# Altium footprint library CPU_STM.PcbLib: 216 footprints (part 5 of 15) (continued)
## ENVEST_BOTTOM [mm] (continued)
; 9.194,-2.454 9.397,-2.454 ; 9.194,-2.404 9.346,-2.404 ; 9.194,-2.353 9.295,-2.353 ; 9.194,-2.302 9.295,-2.302 ; 9.194,-2.251 9.295,-2.251 ; 9.194,-2.2 9.295,-2.2 ; 9.194,-2.15 9.295,-2.15 ; 9.194,-1.743 9.346,-1.743 ; 9.194,-1.692 9.346,-1.692 ; 9.194,-1.642 9.346,-1.642 ; 9.194,-1.591 9.346,-1.591 ; 9.194,-1.54 9.346,-1.54 ; 9.194,-1.489 9.346,-1.489 ; 9.194,-1.438 9.346,-1.438 ; 9.194,-1.388 9.346,-1.388 ; 9.194,-1.337 9.346,-1.337 ; 9.194,0.035 10.515,0.035 ; 9.194,0.086 10.515,0.086 ; 9.194,0.136 10.565,0.136 ; 9.245,-2.505 9.397,-2.505 ; 9.245,-1.286 9.346,-1.286 ; 9.245,-1.235 9.346,-1.235 ; 9.245,-0.067 10.464,-0.067 ; 9.245,-0.016 10.515,-0.016 ; 9.295,-2.556 9.397,-2.556 ; 9.295,-0.219 10.413,-0.219 ; 9.295,-0.168 10.464,-0.168 ; 9.295,-0.118 10.464,-0.118 ; 9.346,-0.372 10.362,-0.372 ; 9.346,-0.321 10.362,-0.321 ; 9.346,-0.27 10.413,-0.27 ; 9.397,-0.524 10.311,-0.524 ; 9.397,-0.473 10.311,-0.473 ; 9.397,-0.422 10.362,-0.422 ; 9.448,-0.575 10.261,-0.575 ; 9.651,-2.454 9.956,-2.454 ; 9.651,-2.404 9.753,-2.404 ; 9.651,-2.353 9.753,-2.353 ; 9.651,-2.302 9.753,-2.302 ; 9.651,-2.251 9.753,-2.251 ; 9.651,-2.2 9.753,-2.2 ; 9.651,-2.15 9.753,-2.15 ; 9.651,-2.099 9.753,-2.099 ; 9.651,-2.048 9.753,-2.048 ; 9.651,-1.997 9.803,-1.997 ; 9.651,-1.946 9.803,-1.946 ; 9.651,-1.896 9.803,-1.896 ; 9.651,-1.845 9.803,-1.845 ; 9.651,-1.794 9.803,-1.794 ; 9.651,-1.743 9.803,-1.743 ; 9.702,-2.556 9.854,-2.556 ; 9.702,-2.505 9.905,-2.505 ; 9.803,-1.489 10.007,-1.489 ; 9.803,-1.438 10.007,-1.438 ; 9.803,-1.388 10.007,-1.388 ; 9.854,-2.404 10.007,-2.404 ; 9.854,-1.54 9.956,-1.54 ; 9.854,-1.337 9.956,-1.337 ; 9.905,-2.353 10.057,-2.353 ; 9.905,0.39 10.667,0.39 ; 9.905,0.441 10.667,0.441 ; 9.956,-2.302 10.108,-2.302 ; 9.956,0.492 10.667,0.492 ; 9.956,0.543 10.718,0.543 ; 9.956,0.594 10.718,0.594 ; 9.956,0.644 10.718,0.644 ; 10.007,-2.251 10.159,-2.251 ; 10.007,0.695 10.769,0.695 ; 10.007,0.746 10.769,0.746 ; 10.007,0.797 10.819,0.797 ; 10.007,0.848 10.819,0.848 ; 10.057,-2.2 10.362,-2.2 ; 10.057,0.898 10.819,0.898 ; 10.057,0.949 10.87,0.949 ; 10.057,1 10.87,1 ; 10.057,1.051 10.87,1.051 ; 10.108,-2.15 10.362,-2.15 ; 10.108,-1.489 10.311,-1.489 ; 10.108,-1.438 10.362,-1.438 ; 10.108,-1.388 10.311,-1.388 ; 10.108,1.102 10.921,1.102 ; 10.108,1.152 10.921,1.152 ; 10.108,1.203 10.972,1.203 ; 10.159,-2.099 10.362,-2.099 ; 10.159,-1.54 10.261,-1.54 ; 10.159,-1.337 10.261,-1.337 ; 10.159,1.254 10.972,1.254 ; 10.159,1.305 10.972,1.305 ; 10.159,1.356 11.023,1.356 ; 10.159,1.406 11.023,1.406 ; 10.21,-2.353 10.362,-2.353 ; 10.21,-2.302 10.362,-2.302 ; 10.21,-2.251 10.362,-2.251 ; 10.21,-2.048 10.362,-2.048 ; 10.21,1.457 11.023,1.457 ; 10.21,1.508 11.073,1.508 ; 10.21,1.559 11.073,1.559 ; 10.261,-2.454 10.413,-2.454 ; 10.261,-2.404 10.362,-2.404 ; 10.261,-1.997 10.413,-1.997 ; 10.261,-1.946 10.413,-1.946 ; 10.261,1.61 11.124,1.61 ; 10.261,1.66 11.124,1.66 ; 10.261,1.711 11.124,1.711 ; 10.261,1.762 11.175,1.762 ; 10.311,-2.505 10.616,-2.505 ; 10.311,-1.896 10.464,-1.896 ; 10.311,-1.845 10.464,-1.845 ; 10.311,-1.794 10.464,-1.794 ; 10.311,1.813 11.175,1.813 ; 10.311,1.864 11.175,1.864 ; 10.311,1.914 11.226,1.914 ; 10.311,1.965 11.226,1.965 ; 10.362,-2.556 10.565,-2.556 ; 10.362,-1.743 10.413,-1.743 ; 10.362,2.016 11.226,2.016 ; 10.515,-2.454 10.616,-2.454 ; 10.769,-2.353 11.073,-2.353 ; 10.819,-2.556 10.972,-2.556 ; 10.819,-2.505 10.972,-2.505 ; 10.819,-2.454 11.023,-2.454 ; 10.819,-2.404 11.073,-2.404 ; 10.819,-2.302 10.921,-2.302 ; 10.819,-2.251 10.921,-2.251 ; 10.819,-2.2 10.921,-2.2 ; 10.819,-2.15 10.921,-2.15 ; 10.819,-2.099 10.921,-2.099 ; 10.819,-2.048 10.921,-2.048 ; 10.819,-1.997 10.972,-1.997 ; 10.819,-1.946 10.921,-1.946 ; 10.819,-1.896 10.921,-1.896 ; 10.819,-1.845 10.921,-1.845 ; 10.819,-1.794 10.921,-1.794 ; 10.972,-2.302 11.124,-2.302 ; 11.023,-2.251 11.175,-2.251 ; 11.023,-2.2 11.226,-2.2 ; 11.073,-2.15 11.226,-2.15 ; 11.124,-2.099 11.277,-2.099 ; 11.175,-2.048 11.277,-2.048 ; 11.175,-1.997 11.327,-1.997 ; 11.226,-1.946 11.378,-1.946 ; 11.226,-1.896 11.531,-1.896 ; 11.277,-1.845 11.531,-1.845 ; 11.327,-1.794 11.48,-1.794 ; 11.327,0.39 12.14,0.39 ; 11.327,0.441 13.766,0.441 ; 11.327,0.492 13.817,0.492 ; 11.327,0.543 13.817,0.543 ; 11.327,0.594 13.817,0.594 ; 11.327,0.644 13.817,0.644 ; 11.327,0.695 13.817,0.695 ; 11.327,0.746 13.817,0.746 ; 11.327,0.797 13.817,0.797 ; 11.327,0.848 13.817,0.848 ; 11.327,0.898 13.817,0.898 ; 11.327,0.949 13.817,0.949 ; 11.378,-1.743 11.429,-1.743 ; 11.378,0.187 12.293,0.187 ; 11.378,0.238 12.242,0.238 ; 11.378,0.289 12.191,0.289 ; 11.378,0.34 12.191,0.34 ; 11.378,1 13.817,1 ; 11.378,1.051 12.14,1.051 ; 11.378,1.102 12.14,1.102 ; 11.378,1.152 12.191,1.152 ; 11.429,-2.251 11.581,-2.251 ; 11.429,-2.2 11.581,-2.2 ; 11.429,-2.15 11.531,-2.15 ; 11.429,-2.099 11.531,-2.099 ; 11.429,-2.048 11.531,-2.048 ; 11.429,-1.997 11.531,-1.997 ; 11.429,-1.946 11.531,-1.946 ; 11.429,0.086 12.445,0.086 ; 11.429,0.136 12.343,0.136 ; 11.429,1.203 12.191,1.203 ; 11.429,1.254 12.191,1.254 ; 11.429,1.305 12.242,1.305 ; 11.48,-2.454 11.785,-2.454 ; 11.48,-2.404 11.632,-2.404 ; 11.48,-2.353 11.581,-2.353 ; 11.48,-2.302 11.581,-2.302 ; 11.48,-0.016 13.613,-0.016 ; 11.48,0.035 12.597,0.035 ; 11.48,1.356 12.293,1.356 ; 11.48,1.406 12.343,1.406 ; 11.531,-2.505 11.734,-2.505 ; 11.531,-0.118 13.613,-0.118 ; 11.531,-0.067 13.613,-0.067 ; 11.531,1.457 12.394,1.457 ; 11.531,1.508 13.664,1.508 ; 11.581,-0.168 13.613,-0.168 ; 11.581,1.559 13.613,1.559 ; 11.632,-0.219 13.613,-0.219 ; 11.632,1.61 13.613,1.61 ; 11.683,-2.404 11.835,-2.404 ; 11.683,-0.27 13.664,-0.27 ; 11.683,1.66 13.563,1.66 ; 11.734,-2.353 11.886,-2.353 ; 11.734,-0.321 13.664,-0.321 ; 11.734,1.711 13.512,1.711 ; 11.785,-2.302 11.937,-2.302 ; 11.785,-0.372 13.664,-0.372 ; 11.785,1.762 13.461,1.762 ; 11.835,-2.251 11.937,-2.251 ; 11.835,1.813 13.41,1.813 ; 11.886,-2.2 11.937,-2.2 ; 11.886,-0.422 13.664,-0.422 ; 11.886,1.864 13.359,1.864 ; 11.937,-0.473 13.664,-0.473 ; 11.988,-3.013 12.14,-3.013 ; 11.988,-2.962 12.14,-2.962 ; 11.988,-2.912 12.14,-2.912 ; 11.988,1.914 13.309,1.914 ; 12.039,-3.115 12.191,-3.115 ; 12.039,-3.064 12.14,-3.064 ; 12.039,-2.861 12.191,-2.861 ; 12.039,-2.353 12.191,-2.353 ; 12.039,-2.302 12.191,-2.302 ; 12.089,-3.166 12.242,-3.166 ; 12.089,-2.81 12.293,-2.81 ; 12.089,-2.556 12.394,-2.556 ; 12.089,-2.505 12.445,-2.505 ; 12.089,-2.454 12.191,-2.454 ; 12.089,-2.404 12.191,-2.404 ; 12.089,-2.251 12.191,-2.251 ; 12.089,-2.2 12.191,-2.2 ; 12.089,-2.15 12.191,-2.15 ; 12.089,-2.099 12.242,-2.099 ; 12.089,-2.048 12.242,-2.048 ; 12.089,-1.997 12.242,-1.997 ; 12.089,-1.946 12.242,-1.946 ; 12.089,-1.896 12.242,-1.896 ; 12.089,-1.845 12.242,-1.845 ; 12.089,-1.794 12.242,-1.794 ; 12.089,-1.743 12.242,-1.743 ; 12.089,-1.692 12.191,-1.692 ; 12.089,-0.524 13.512,-0.524 ; 12.089,1.965 13.207,1.965 ; 12.14,-3.216 12.343,-3.216 ; 12.14,-2.759 12.343,-2.759 ; 12.14,-2.607 12.293,-2.607 ; 12.191,-3.267 12.801,-3.267 ; 12.191,2.016 13.105,2.016 ; 12.242,-2.708 12.293,-2.708 ; 12.242,-0.575 13.359,-0.575 ; 12.293,-3.318 12.75,-3.318 ; 12.293,-2.454 12.496,-2.454 ; 12.343,-2.404 12.597,-2.404 ; 12.394,2.067 12.902,2.067 ; 12.445,-2.353 12.648,-2.353 ; 12.445,-0.626 13.055,-0.626 ; 12.496,-2.302 12.699,-2.302 ; 12.597,-2.251 12.75,-2.251 ; 12.597,-2.2 12.801,-2.2 ; 12.648,-3.216 12.851,-3.216 ; 12.648,-2.15 13.004,-2.15 ; 12.699,-3.166 12.902,-3.166 ; 12.699,-2.099 12.851,-2.099 ; 12.75,-2.048 13.004,-2.048 ; 12.801,-3.115 12.902,-3.115 ; 12.801,-3.064 12.953,-3.064 ; 12.801,-1.997 13.004,-1.997 ; 12.801,1.457 13.664,1.457 ; 12.851,-3.013 12.953,-3.013 ; 12.851,-2.962 13.004,-2.962 ; 12.851,-2.912 13.004,-2.912 ; 12.851,-2.861 13.004,-2.861 ; 12.851,-2.81 13.004,-2.81 ; 12.851,-2.759 13.004,-2.759 ; 12.851,-2.708 13.004,-2.708 ; 12.851,-2.658 13.004,-2.658 ; 12.851,-2.607 13.004,-2.607 ; 12.851,-2.556 13.004,-2.556 ; 12.851,-2.505 13.004,-2.505 ; 12.851,-2.454 13.004,-2.454 ; 12.851,-2.404 13.004,-2.404 ; 12.851,-2.353 13.004,-2.353 ; 12.851,-2.302 13.004,-2.302 ; 12.851,-2.251 13.004,-2.251 ; 12.851,-2.2 13.004,-2.2 ; 12.851,-1.946 13.004,-1.946 ; 12.851,-1.896 13.004,-1.896 ; 12.851,-1.845 13.004,-1.845 ; 12.851,-1.794 13.004,-1.794 ; 12.851,-1.743 13.004,-1.743 ; 12.851,-1.692 12.953,-1.692 ; 12.851,1.406 13.715,1.406 ; 12.902,-2.099 13.004,-2.099 ; 12.902,1.356 13.715,1.356 ; 12.953,1.254 13.766,1.254 ; 12.953,1.305 13.766,1.305 ; 13.004,1.051 13.817,1.051 ; 13.004,1.102 13.817,1.102 ; 13.004,1.152 13.766,1.152 ; 13.004,1.203 13.766,1.203 ; 13.207,0.035 13.563,0.035 ; 13.258,-2.505 13.563,-2.505 ; 13.258,-2.454 13.613,-2.454 ; 13.258,-2.404 13.359,-2.404 ; 13.258,-2.353 13.41,-2.353 ; 13.258,-2.302 13.41,-2.302 ; 13.309,-2.556 13.512,-2.556 ; 13.309,-2.251 13.41,-2.251 ; 13.309,-2.2 13.41,-2.2 ; 13.309,-2.15 13.41,-2.15 ; 13.309,-2.099 13.461,-2.099 ; 13.309,-2.048 13.461,-2.048 ; 13.359,-2.607 13.41,-2.607 ; 13.359,-1.997 13.461,-1.997 ; 13.359,-1.946 13.461,-1.946 ; 13.359,-1.896 13.512,-1.896 ; 13.359,-1.845 13.512,-1.845 ; 13.41,-1.794 13.512,-1.794 ; 13.41,-1.743 13.563,-1.743 ; 13.41,-1.692 14.02,-1.692 ; 13.41,0.086 13.563,0.086 ; 13.461,-2.404 13.664,-2.404 ; 13.461,-1.642 13.867,-1.642 ; 13.512,-2.353 13.664,-2.353 ; 13.563,-2.302 13.715,-2.302 ; 13.563,-1.591 13.715,-1.591 ; 13.613,-2.251 13.766,-2.251 ; 13.664,-2.2 13.969,-2.2 ; 13.715,-2.15 13.817,-2.15 ; 13.715,-2.099 13.969,-2.099 ; 13.766,-2.048 13.969,-2.048 ; 13.766,-1.743 14.02,-1.743 ; 13.817,-2.454 14.02,-2.454 ; 13.817,-2.353 13.969,-2.353 ; 13.817,-2.302 13.969,-2.302 ; 13.817,-2.251 13.969,-2.251 ; 13.817,-1.997 13.969,-1.997 ; 13.817,-1.946 13.969,-1.946 ; 13.867,-2.556 14.02,-2.556 ; 13.867,-2.505 14.02,-2.505 ; 13.867,-2.404 13.969,-2.404 ; 13.867,-2.15 13.969,-2.15 ; 13.867,-1.896 14.02,-1.896 ; 13.867,-1.845 14.02,-1.845 ; 13.867,-1.794 14.02,-1.794 ; 14.071,-0.422 15.747,-0.422 ; 14.121,-0.473 15.696,-0.473 ; 14.121,-0.372 15.849,-0.372 ; 14.121,-0.321 15.899,-0.321 ; 14.121,-0.27 15.899,-0.27 ; 14.121,-0.219 15.95,-0.219 ; 14.172,-0.168 16.001,-0.168 ; 14.172,-0.118 16.001,-0.118 ; 14.172,-0.067 16.052,-0.067 ; 14.172,-0.016 14.833,-0.016 ; 14.172,1 15.442,1 ; 14.172,1.051 15.341,1.051 ; 14.172,1.102 15.188,1.102 ; 14.172,1.152 15.087,1.152 ; 14.172,1.203 15.036,1.203 ; 14.172,1.254 14.985,1.254 ; 14.172,1.305 14.985,1.305 ; 14.172,1.356 14.985,1.356 ; 14.172,1.406 15.036,1.406 ; 14.172,1.457 15.087,1.457 ; 14.223,0.035 14.579,0.035 ; 14.223,0.086 14.426,0.086 ; 14.223,0.136 14.325,0.136 ; 14.223,0.898 15.696,0.898 ; 14.223,0.949 15.595,0.949 ; 14.223,1.508 15.849,1.508 ; 14.223,1.559 15.899,1.559 ; 14.274,-0.524 15.595,-0.524 ; 14.274,0.848 15.747,0.848 ; 14.274,1.61 15.899,1.61 ; 14.274,1.66 15.899,1.66 ; 14.325,0.746 15.849,0.746 ; 14.325,0.797 15.798,0.797 ; 14.325,1.711 15.899,1.711 ; 14.375,1.762 15.95,1.762 ; 14.426,-0.575 15.442,-0.575 ; 14.426,0.695 15.899,0.695 ; 14.426,1.813 15.95,1.813 ; 14.477,0.644 15.95,0.644 ; 14.477,1.864 15.95,1.864 ; 14.528,0.594 16.001,0.594 ; 14.528,1.914 15.95,1.914 ; 14.629,0.543 16.001,0.543 ; 14.629,1.965 15.899,1.965 ; 14.68,-0.626 15.239,-0.626 ; 14.731,0.492 16.052,0.492 ; 14.731,2.016 15.747,2.016 ; 14.782,-3.064 14.934,-3.064 ; 14.782,-3.013 14.883,-3.013 ; 14.782,-2.962 14.934,-2.962 ; 14.782,-2.912 14.934,-2.912 ; 14.833,-3.115 14.985,-3.115 ; 14.833,-2.861 14.985,-2.861 ; 14.833,-2.81 15.036,-2.81 ; 14.833,-2.404 14.985,-2.404 ; 14.833,-2.353 14.985,-2.353 ; 14.833,-2.302 14.985,-2.302 ; 14.833,-2.251 14.985,-2.251 ; 14.833,0.441 16.052,0.441 ; 14.883,-3.166 15.036,-3.166 ; 14.883,-2.556 15.188,-2.556 ; 14.883,-2.505 15.239,-2.505 ; 14.883,-2.454 14.985,-2.454 ; 14.883,-2.2 14.985,-2.2 ; 14.883,-2.15 14.985,-2.15 ; 14.883,-2.099 14.985,-2.099 ; 14.883,-2.048 14.985,-2.048 ; 14.883,-1.997 14.985,-1.997 ; 14.883,-1.946 15.036,-1.946 ; 14.883,-1.896 15.036,-1.896 ; 14.883,-1.845 15.036,-1.845 ; 14.883,-1.794 15.036,-1.794 ; 14.883,-1.743 14.985,-1.743 ; 14.883,-1.692 14.985,-1.692 ; 14.934,-3.216 15.137,-3.216 ; 14.934,-2.759 15.087,-2.759 ; 14.934,-2.607 15.087,-2.607 ; 14.934,2.067 15.544,2.067 ; 14.985,-3.267 15.595,-3.267 ; 14.985,0.39 16.052,0.39 ; 15.036,-3.318 15.493,-3.318 ; 15.036,-2.708 15.087,-2.708 ; 15.036,-2.454 15.29,-2.454 ; 15.087,-0.016 16.052,-0.016 ; 15.137,-2.404 15.341,-2.404 ; 15.137,0.34 16.052,0.34 ; 15.188,0.035 16.052,0.035 ; 15.188,0.289 16.103,0.289 ; 15.239,-2.353 15.442,-2.353 ; 15.239,0.086 16.052,0.086 ; 15.239,0.136 16.103,0.136 ; 15.239,0.187 16.103,0.187 ; 15.239,0.238 16.103,0.238 ; 15.29,-2.302 15.493,-2.302 ; 15.341,-2.251 15.544,-2.251 ; 15.391,-3.216 15.645,-3.216 ; 15.391,-2.2 15.544,-2.2 ; 15.442,-2.15 15.595,-2.15 ; 15.442,1.457 15.849,1.457 ; 15.493,-3.166 15.696,-3.166 ; 15.493,-2.099 15.798,-2.099 ; 15.544,-3.115 15.696,-3.115 ; 15.544,-2.048 15.798,-2.048 ; 15.595,-3.064 15.747,-3.064 ; 15.595,-1.997 15.747,-1.997 ; 15.595,-1.946 15.798,-1.946 ; 15.595,-1.896 15.798,-1.896 ; 15.595,-1.794 15.798,-1.794 ; 15.595,-1.743 15.747,-1.743 ; 15.645,-3.013 15.747,-3.013 ; 15.645,-2.962 15.747,-2.962 ; 15.645,-2.912 15.747,-2.912 ; 15.645,-2.861 15.798,-2.861 ; 15.645,-2.81 15.798,-2.81 ; 15.645,-2.759 15.747,-2.759 ; 15.645,-2.708 15.798,-2.708 ; 15.645,-2.658 15.747,-2.658 ; 15.645,-2.607 15.747,-2.607 ; 15.645,-2.556 15.798,-2.556 ; 15.645,-2.505 15.798,-2.505 ; 15.645,-2.454 15.798,-2.454 ; 15.645,-2.404 15.798,-2.404 ; 15.645,-2.353 15.798,-2.353 ; 15.645,-2.302 15.798,-2.302 ; 15.645,-2.251 15.798,-2.251 ; 15.645,-2.2 15.798,-2.2 ; 15.645,-2.15 15.798,-2.15 ; 15.645,-1.845 15.798,-1.845 ; 15.645,-1.692 15.747,-1.692 ; 15.645,1.406 15.849,1.406 ; 15.747,1.356 15.849,1.356 ; 16.052,-2.556 16.458,-2.556 ; 16.052,-2.505 16.153,-2.505 ; 16.052,-2.454 16.153,-2.454 ; 16.052,-2.404 16.153,-2.404 ; 16.052,-2.353 16.153,-2.353 ; 16.052,-2.302 16.153,-2.302 ; 16.052,-2.251 16.153,-2.251 ; 16.052,-2.2 16.204,-2.2 ; 16.103,-2.607 16.357,-2.607 ; 16.103,-2.15 16.204,-2.15 ; 16.103,-2.099 16.255,-2.099 ; 16.103,-2.048 16.255,-2.048 ; 16.103,-1.997 16.255,-1.997 ; 16.153,-1.946 16.306,-1.946 ; 16.153,-1.896 16.407,-1.896 ; 16.204,-1.845 16.407,-1.845 ; 16.204,-1.794 16.611,-1.794 ; 16.255,-1.743 16.56,-1.743 ; 16.255,1.457 18.033,1.457 ; 16.255,1.508 18.033,1.508 ; 16.255,1.559 18.033,1.559 ; 16.255,1.61 18.033,1.61 ; 16.255,1.66 18.033,1.66 ; 16.255,1.711 18.033,1.711 ; 16.255,1.762 18.033,1.762 ; 16.255,1.813 18.033,1.813 ; 16.255,1.864 18.033,1.864 ; 16.255,1.914 18.033,1.914 ; 16.255,1.965 18.033,1.965 ; 16.306,-2.505 16.509,-2.505 ; 16.306,1.406 18.033,1.406 ; 16.306,2.016 18.033,2.016 ; 16.407,-2.454 16.56,-2.454 ; 16.407,-1.692 16.458,-1.692 ; 16.458,-2.404 16.611,-2.404 ; 16.509,-2.353 16.661,-2.353 ; 16.509,-1.845 16.661,-1.845 ; 16.56,-2.302 16.661,-2.302 ; 16.56,-2.251 16.712,-2.251 ; 16.56,-1.946 16.712,-1.946 ; 16.56,-1.896 16.712,-1.896 ; 16.611,-2.2 16.712,-2.2 ; 16.611,-2.15 16.712,-2.15 ; 16.611,-2.099 16.712,-2.099 ; 16.611,-2.048 16.712,-2.048 ; 16.611,-1.997 16.712,-1.997 ; 16.611,0.136 17.525,0.136 ; 16.611,0.187 17.525,0.187 ; 16.611,0.238 17.474,0.238 ; 16.611,0.289 17.474,0.289 ; 16.611,0.34 17.474,0.34 ; 16.611,0.39 17.474,0.39 ; 16.611,0.441 17.474,0.441 ; 16.611,0.492 17.474,0.492 ; 16.611,0.543 17.474,0.543 ; 16.611,0.594 17.474,0.594 ; 16.611,0.644 17.474,0.644 ; 16.611,0.695 17.474,0.695 ; 16.611,0.746 17.474,0.746 ; 16.611,0.797 17.474,0.797 ; 16.611,0.848 17.474,0.848 ; 16.611,0.898 17.474,0.898 ; 16.611,0.949 17.474,0.949 ; 16.611,1 17.474,1 ; 16.611,1.051 17.474,1.051 ; 16.611,1.102 17.474,1.102 ; 16.611,1.152 17.474,1.152 ; 16.611,1.203 17.474,1.203 ; 16.611,1.254 17.474,1.254 ; 16.611,1.305 17.474,1.305 ; 16.611,1.356 17.474,1.356 ; 16.611,2.067 17.474,2.067 ; 16.611,2.118 17.474,2.118 ; 16.611,2.168 17.474,2.168 ; 16.611,2.219 17.474,2.219 ; 16.611,2.27 17.474,2.27 ; 16.611,2.321 17.474,2.321 ; 16.611,2.372 17.474,2.372 ; 16.611,2.422 17.474,2.422 ; 16.611,2.473 17.474,2.473 ; 16.661,-0.118 18.033,-0.118 ; 16.661,-0.067 18.033,-0.067 ; 16.661,-0.016 18.033,-0.016 ; 16.661,0.035 18.033,0.035 ; 16.661,0.086 17.627,0.086 ; 16.712,-0.219 18.033,-0.219 ; 16.712,-0.168 18.033,-0.168 ; 16.712,2.524 17.474,2.524 ; 16.763,-0.321 18.033,-0.321 ; 16.763,-0.27 18.033,-0.27 ; 16.814,-0.372 18.033,-0.372 ; 16.865,-0.422 18.033,-0.422 ; 16.915,-2.556 17.017,-2.556 ; 16.915,-2.505 17.017,-2.505 ; 16.915,-2.454 17.068,-2.454 ; 16.915,-2.404 17.068,-2.404 ; 16.915,-2.353 17.068,-2.353 ; 16.915,-2.302 17.068,-2.302 ; 16.915,-2.251 17.068,-2.251 ; 16.915,-2.2 17.068,-2.2 ; 16.915,-2.15 17.068,-2.15 ; 16.915,-2.099 17.119,-2.099 ; 16.915,-2.048 17.119,-2.048 ; 16.915,-1.997 17.169,-1.997 ; 16.915,-1.946 17.017,-1.946 ; 16.915,-1.896 17.017,-1.896 ; 16.915,-1.845 17.017,-1.845 ; 16.915,-1.794 17.017,-1.794 ; 16.915,-1.743 17.017,-1.743 ; 16.915,-1.692 17.017,-1.692 ; 16.915,-1.642 17.017,-1.642 ; 16.915,-1.591 17.017,-1.591 ; 16.915,-1.54 17.017,-1.54 ; 16.915,-1.489 17.017,-1.489 ; 16.915,-1.438 17.017,-1.438 ; 16.915,-1.388 17.017,-1.388 ; 16.915,-1.337 17.017,-1.337 ; 16.915,-0.473 18.033,-0.473 ; 16.915,2.575 17.474,2.575 ; 17.017,-0.524 18.033,-0.524 ; 17.068,-1.946 17.169,-1.946 ; 17.068,-1.896 17.22,-1.896 ; 17.068,2.626 17.474,2.626 ; 17.119,-1.845 17.322,-1.845 ; 17.119,-0.575 17.982,-0.575 ; 17.169,-2.2 17.576,-2.2 ; 17.169,-2.15 17.322,-2.15 ; 17.169,-2.099 17.271,-2.099 ; 17.169,-1.794 17.423,-1.794 ; 17.22,-2.251 17.474,-2.251 ; 17.22,-1.743 17.779,-1.743 ; 17.271,-2.302 17.423,-2.302 ; 17.271,-0.626 17.728,-0.626 ; 17.271,2.676 17.474,2.676 ; 17.322,-2.353 17.474,-2.353 ; 17.322,-1.692 17.728,-1.692 ; 17.373,-2.454 17.576,-2.454 ; 17.373,-2.404 17.474,-2.404 ; 17.423,-2.505 17.627,-2.505 ; 17.423,-2.15 17.677,-2.15 ; 17.474,-2.556 17.931,-2.556 ; 17.525,-2.607 17.931,-2.607 ; 17.525,-2.099 17.728,-2.099 ; 17.627,-2.658 17.83,-2.658 ; 17.627,-2.048 17.779,-2.048 ; 17.677,-1.997 17.83,-1.997 ; 17.677,-1.794 17.83,-1.794 ; 17.728,-1.946 17.83,-1.946 ; 17.728,-1.896 17.83,-1.896 ; 17.728,-1.845 17.83,-1.845 ; 17.83,-2.505 17.982,-2.505 ; 17.881,-2.454 17.982,-2.454 ; 17.931,-2.404 18.033,-2.404
Bottom Solder:
  drawing of 1352 lines, arcs and shapes, not listed